# Altium footprint library EPCOS.PcbLib: 178 footprints (part 3 of 12)
Each footprint in its own frame and in the unit in brackets; x right, y up, seen from the top. Pads: shape width x height; smd on the part's side, far side on the other; paste and mask are expansions set on the pad; w line width, h text height; cw(c..) or ccw(c..) is an arc to the next point about the centre after c.
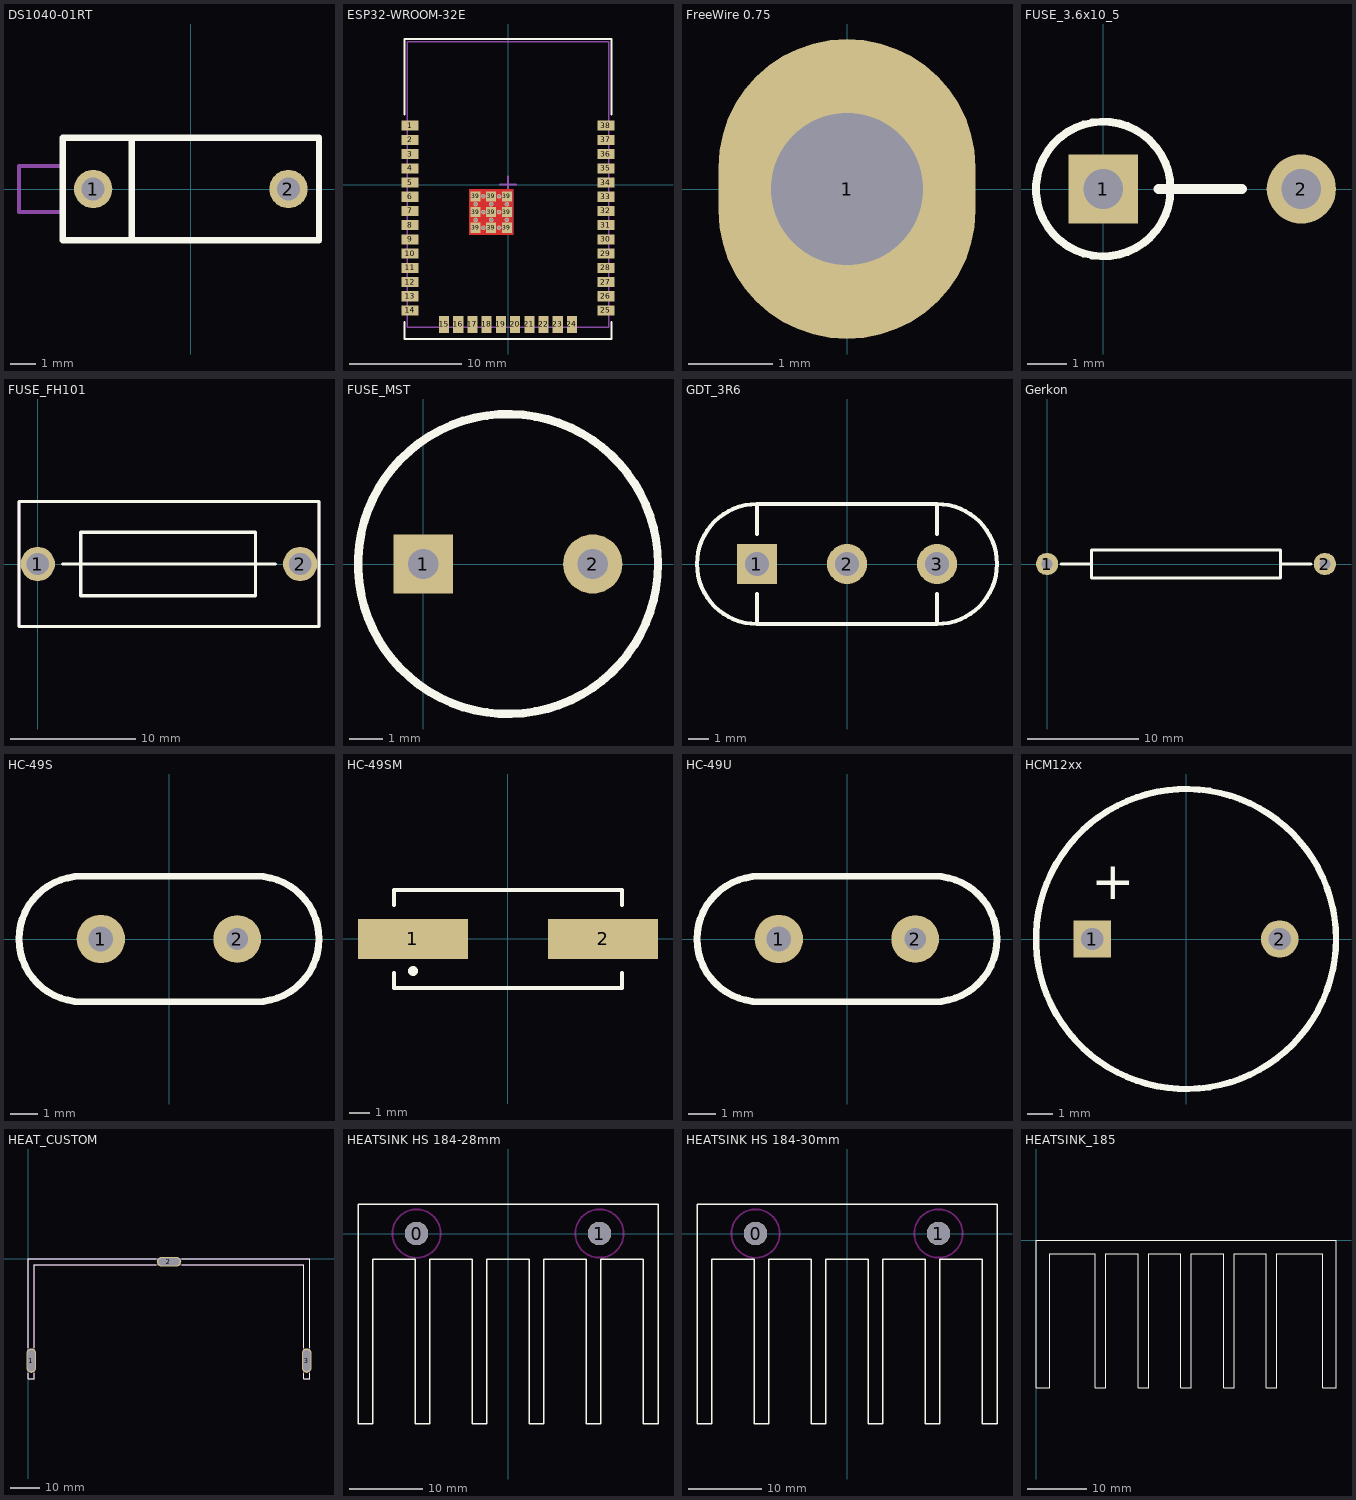
[diagram p2: the footprints below, top view; thin cyan lines are the x and y axes]

## DS1040-01RT [mm]
height 7
pads (2):
  round 1.5 hole 0.9 unplated: 1(-3.81,0) 2(3.81,0)
Top Overlay:
  lines w0.25: -2.3,-2 -2.3,2 ; -5,-2 -5,2 5,2 5,-2 -5,-2
Mechanical 15:
  lines w0.15: -5,-2 -5,-0.9 -6.7,-0.9 -6.7,0.9 -5,0.9 -5,2 ; -4.95,-2 4.95,-2 ; -4.95,2 4.95,2 ; 5,-2 5,2
3D body "User Library-DS1040-01RT.STEP": height 8.15, standoff -4.15, extent -6.75,-2 4.95,2

## ESP32-WROOM-32E [mm] "ESP32-WROOM-32E Wi-Fi Module with integrated Antenna"
height 3.2
pads (59):
  rect 1.5x0.9 smd: 1(-8.75,5.26) 2(-8.75,3.99) 3(-8.75,2.72) 4(-8.75,1.45) 5(-8.75,0.18) 6(-8.75,-1.09) 7(-8.75,-2.36) 8(-8.75,-3.63) 9(-8.75,-4.9) 10(-8.75,-6.17) 11(-8.75,-7.44) 12(-8.75,-8.71) 13(-8.75,-9.98) 14(-8.75,-11.25) 25(8.75,-11.25) 26(8.75,-9.98) 27(8.75,-8.71) 28(8.75,-7.44) 29(8.75,-6.17) 30(8.75,-4.9) 31(8.75,-3.63) 32(8.75,-2.36) 33(8.75,-1.09) 34(8.75,0.18) 35(8.75,1.45) 36(8.75,2.72) 37(8.75,3.99) 38(8.75,5.26)
  rect 0.9x1.5 smd: 15(-5.715,-12.5) 16(-4.445,-12.5) 17(-3.175,-12.5) 18(-1.905,-12.5) 19(-0.635,-12.5) 20(0.635,-12.5) 21(1.905,-12.5) 22(3.175,-12.5) 23(4.445,-12.5) 24(5.715,-12.5)
  rect 0.9x0.9 smd: 39(-2.9,-3.86) 39(-2.9,-2.46) 39(-2.9,-1.06) 39(-1.5,-3.86) 39(-1.5,-2.46) 39(-1.5,-1.06) 39(-0.1,-3.86) 39(-0.1,-2.46) 39(-0.1,-1.06)
  round 0.4 hole 0.3: 39(-2.9,-3.16) 39(-2.9,-1.76) 39(-2.2,-3.86) 39(-2.2,-2.46) 39(-2.2,-1.06) 39(-1.5,-3.16) 39(-1.5,-1.76) 39(-0.8,-3.86) 39(-0.8,-2.46) 39(-0.8,-1.06) 39(-0.1,-3.16) 39(-0.1,-1.76)
Top Layer:
  rectangle: -3.5,-4.5 0.5,-0.4
Bottom Layer:
  rectangle: -3.5,-4.5 0.5,-0.4
Top Overlay:
  lines w0.15: -9.25,-12.25 -9.25,-13.8 9.25,-13.8 9.25,-12.25 ; -9.25,6.25 -9.25,13 9.25,13 9.25,6.25
Top Solder:
  rectangle: -3.5,-4.5 0.5,-0.4
Mechanical 7:
  lines w0.15: 0,-0.75 0,0.75
Mechanical 15:
  lines w0.15: -0.75,0 0.75,0 ; -9,-12.75 -9,12.75 9,12.75 9,-12.75 -9,-12.75
3D body "User Library-ESP321.step": height 2.91, standoff -0.01, extent -9,-12.75 9,12.75

## FreeWire 0.75 [mil] "Wire 0.75 mm connection terminal"
pads (1):
  oval 120x140 hole 70.87: 1(0,0)

## FUSE_3.6x10_5 [mm]
height 15
pads (2):
  rect 1.75x1.75 hole 1: 1(0,0)
  round 1.75 hole 1: 2(5,0)
Top Overlay:
  circle w0.2: c0,0 r1.7
  lines w0.254: 1.4,0 3.5,0
3D body "User Library-Fuse 3_6x10.step": height 13.7, standoff -2, extent -1.95,-2 5.35,1.9

## FUSE_FH101 [mm]
height 13.5
pads (2):
  round 2.75 hole 1.8: 1(0,0) 2(21,0)
Top Overlay:
  lines w0.25: -1.5,-5 -1.5,5 22.5,5 22.5,-5 -1.5,-5
  lines w0.254: 2,0 3.445,0 ; 17.345,0 19,0 ; 17.415,0 3.445,0 ; 3.445,0 3.445,2.54 17.415,2.54 17.415,-2.54 3.445,-2.54 3.445,0
Mechanical 13:
  lines w0.25: -1.5,-5 -1.5,5 22.5,5 22.5,-5 -1.5,-5
3D body "User Library-FH-101C.step": height 13.4, standoff -3, extent -2.75,-4.9 23.75,4.9

## FUSE_MST [mil]
height 354
pads (2):
  rect 70x70 hole 35.43: 1(0,0)
  round 70 hole 35.43: 2(200,0)
Top Overlay:
  circle w10: c100,0 r177
3D body: height 354, standoff 0, extent -76.98,-176.98 276.98,176.98

## GDT_3R6 [mm]
height 10
pads (3):
  rect 2x2 hole 1.2: 1(-4.5,0)
  round 2 hole 1.2: 2(0,0) 3(4.5,0)
Top Overlay:
  lines w0.2: -4.5,-1.5 -4.5,-3 ; -4.5,1.5 -4.5,3 ; 4.5,-1.5 4.5,-3 ; 4.5,1.5 4.5,3 ; -4.5,-3 cw(c-4.5,0) -4.5,3 ; -4.5,-3 4.5,-3 ; -4.5,3 4.5,3 ; 4.5,-3 ccw(c4.5,0) 4.5,3
3D body "User Library-B88069X-T23-A350X.step": height 12.9, standoff -2.5, extent -6.7,-4 6.7,4

## Gerkon [mm]
height 10
pads (2):
  round 2 hole 1: 1(0,0) 2(25,0)
Top Overlay:
  lines w0.254: 1.25,0 4,0 ; 21,0 23.75,0 ; 4,-1.25 4,1.25 21,1.25 21,-1.25 4,-1.25

## HC-49S [mm]
height 4.2
pads (2):
  round 1.778 hole 0.9: 1(-2.5,0)
  round 1.75 hole 0.8: 2(2.5,0)
Top Overlay:
  lines w0.254: -3.2,-2.3 cw(c-3.2,0) -3.2,2.3 3.2,2.3 cw(c3.2,0) 3.2,-2.3 -3.2,-2.3
3D body "User Library-HC-49.step": height 3.5, standoff -3, extent -5.4,-2.25 5.4,2.25

## HC-49SM [mm]
height 5
pads (2):
  rect 5.5x2 smd: 1(-4.75,0) 2(4.75,0)
Top Overlay:
  circle w0.25: c-4.75,-1.6 r0.125
  lines w0.2: -5.7,-1.7 -5.7,-2.45 5.7,-2.45 5.7,-1.7 ; -5.7,1.7 -5.7,2.45 5.7,2.45 5.7,1.7
3D body "User Library-Crystal HC49_US-SM.step": height 4.3, standoff 0, extent -6.36,-2.415 6.44,2.415

## HC-49U [mm]
height 13.5
pads (2):
  round 1.778 hole 0.9: 1(-2.5,0)
  round 1.75 hole 0.8: 2(2.5,0)
Top Overlay:
  lines w0.254: -3.2,-2.3 cw(c-3.2,0) -3.2,2.3 3.2,2.3 cw(c3.2,0) 3.2,-2.3 -3.2,-2.3
3D body "User Library-HC49U-2.step": height 13.2, standoff -2, extent -5.5,-2.25 5.5,2.25

## HCM12xx [mm] "Buzzer 12mm"
height 9
pads (2):
  rect 1.5x1.5 hole 0.9: 1(-3.75,0)
  round 1.5 hole 0.9: 2(3.75,0)
Top Overlay:
  circle w0.254: c0,0 r6.001
  text "+" at -3.8,1.6 h1.52
3D body "User Library-HCM1206X.step": height 9.5, standoff -6.5, extent -6,-6 6,6

## HEAT_CUSTOM [mm]
height 22
pads (3):
  oval 3.2x8.2 hole 2.3 slot 7 at 90 deg: 1(1,-34) 3(93,-34)
  oval 8.2x3.2 hole 2.3 slot 7 at 0 deg: 2(47,-1)
Top Overlay:
  lines w0.254: 0,-38.25 0,-40 2,-40 2,-38.25 ; 0,-29.75 0,0 42.75,0 ; 2,-29.75 2,-2 42.75,-2 ; 51.25,-2 92,-2 92,-29.75 ; 51.25,0 94,0 94,-29.75 ; 92,-38.25 92,-40 94,-40 94,-38.25
Mechanical 13:
  lines w0.254: 2.5,0 91.5,0 ; 0,-40 0,0 94,0 94,-40 92,-40 92,-2 2,-2 2,-40 0,-40 ; 0,-36.5 2,-36.5 2,-31.5 0,-31.5 0,-36.5 ; 44.5,-2 44.5,0 49.5,0 49.5,-2 44.5,-2 ; 92,-36.5 94,-36.5 94,-31.5 92,-31.5 92,-36.5
3D body: height 23, standoff 0, extent 49.501,-1.999 91.499,-0.001
3D body: height 23, standoff 0, extent 91.501,-31.499 93.999,-0.001
3D body: height 23, standoff -4, extent 92.001,-36.499 93.999,-31.501
3D body: height 23, standoff 0, extent 0.001,-39.999 1.999,-36.501
3D body: height 23, standoff -4, extent 0.001,-36.499 1.999,-31.501
3D body: height 23, standoff 0, extent 0.001,-31.499 44.499,-0.001
3D body: height 23, standoff -4, extent 44.501,-1.999 49.499,-0.001
3D body: height 23, standoff 0, extent 92.001,-39.999 93.999,-36.501
3D body: height 23, standoff -4, extent 92.001,-36.499 93.999,-31.501

## HEATSINK HS 184-28mm [mm]
height 28
pads (2):
  round 3.2 hole 3.175 unplated: 0(-12.5,0) 1(12.5,0)
Top Overlay:
  lines w0.2: -20.5,-26 -20.5,4 20.5,4 20.5,-26 18.5,-26 18.5,-3.5 12.7,-3.5 12.7,-26 10.7,-26 10.7,-3.5 4.9,-3.5 4.9,-26 2.9,-26 2.9,-3.5 -2.9,-3.5 -2.9,-26 -4.9,-26 -4.9,-3.5 -10.7,-3.5 -10.7,-26 -12.7,-26 -12.7,-3.5 -18.5,-3.5 -18.5,-26 -20.5,-26
Keep-Out Layer:
  circle w0.254: c12.5,0 r3.302
  circle w0.254: c-12.5,-0.01 r3.302
3D body "HS 184-28.STEP": height 28, standoff 0, extent -20.5,-26 20.5,4

## HEATSINK HS 184-30mm [mm]
height 30
pads (2):
  round 3.2 hole 3.175 unplated: 0(-12.5,0) 1(12.5,0)
Top Overlay:
  lines w0.2: -20.5,-26 -18.5,-26 -18.5,-3.5 -12.7,-3.5 -12.7,-26 -10.7,-26 -10.7,-3.5 -4.9,-3.5 -4.9,-26 -2.9,-26 -2.9,-3.5 2.9,-3.5 2.9,-26 4.9,-26 4.9,-3.5 10.7,-3.5 10.7,-26 12.7,-26 12.7,-3.5 18.5,-3.5 18.5,-26 20.5,-26 20.5,4 -20.5,4 -20.5,-26
Keep-Out Layer:
  circle w0.254: c-12.5,-0.01 r3.302
  circle w0.254: c12.5,0 r3.302
3D body "HS 184-30.STEP": height 30, standoff 0, extent -20.5,-26 20.5,4

## HEATSINK_185 [mm]
height 29.972
Top Overlay:
  lines w0.178: 0,-25.019 0,0 50.8,0 50.8,-25.019 48.514,-25.019 48.514,-2.286 40.767,-2.286 40.767,-25.019 38.989,-25.019 38.989,-2.286 33.528,-2.286 33.528,-25.019 31.75,-25.019 31.75,-2.286 26.289,-2.286 26.289,-25.019 24.511,-25.019 24.511,-2.286 19.05,-2.286 19.05,-25.019 17.272,-25.019 17.272,-2.286 11.811,-2.286 11.811,-25.019 10.033,-25.019 10.033,-2.286 2.286,-2.286 2.286,-25.019 0,-25.019
3D body: height 29.97, standoff 0, extent 0.001,-25.018 50.799,-0.001